# Altium footprint library Connector.PcbLib: 536 footprints (part 34 of 34)
Each footprint in its own frame and in the unit in brackets; x right, y up, seen from the top. Pads: shape width x height; smd on the part's side, far side on the other; paste and mask are expansions set on the pad; w line width, h text height; cw(c..) or ccw(c..) is an arc to the next point about the centre after c.
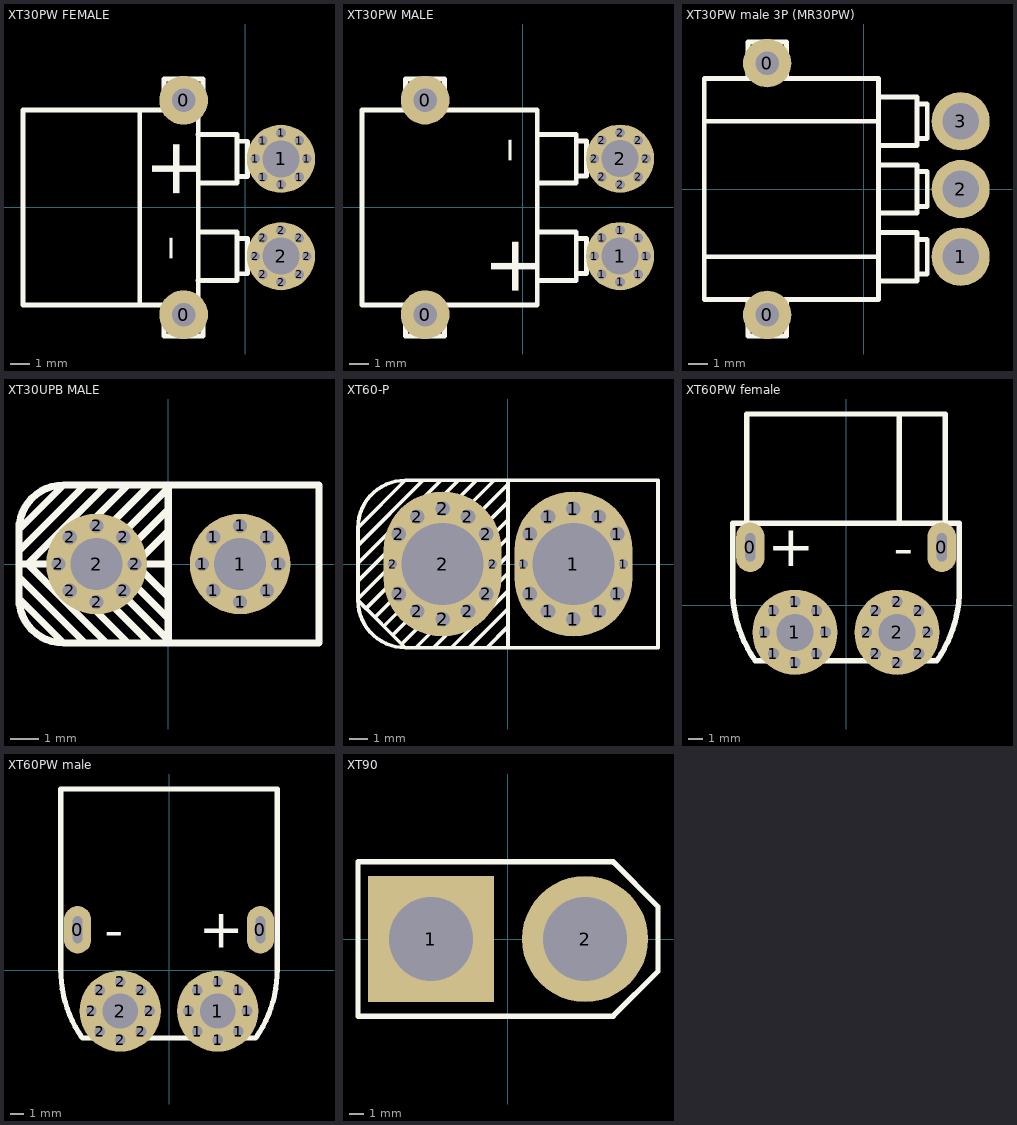
[diagram p33: the footprints below, top view; thin cyan lines are the x and y axes]

## XT30PW FEMALE [mm] "XT30PW卧式母头"
pads (20):
  round 2.5 hole 1.2: 0(-3.175,-5.5) 0(-3.175,5.5)
  round 0.75 hole 0.5: 1(0.5,2.5) 1(0.888,1.563) 1(0.888,3.437) 1(1.825,1.175) 1(1.825,3.825) 1(2.762,1.563) 1(2.762,3.437) 1(3.15,2.5) 2(0.5,-2.5) 2(0.888,-1.563) 2(0.888,-3.437) 2(1.825,-3.825) 2(1.825,-1.175) 2(2.762,-3.437) 2(2.762,-1.563) 2(3.15,-2.5)
  round 3.5 hole 1.9: 1(1.825,2.5) 2(1.825,-2.5)
Top Overlay:
  lines w0.254: -5.425,-5 -5.425,5 ; -4.175,-5 -4.175,-6.592 -2.175,-6.592 -2.175,-5 ; -4.175,5 -4.175,6.592 -2.175,6.592 -2.175,5 ; -2.425,-3.75 -0.425,-3.75 -0.425,-1.25 -2.425,-1.25 ; -2.425,3.75 -0.425,3.75 -0.425,1.25 -2.425,1.25 ; -0.425,-3.4 0.098,-3.4 0.098,-1.6 -0.425,-1.6 ; -0.425,1.6 0.098,1.6 0.098,3.4 -0.425,3.4 ; -11.425,-5 -2.425,-5 -2.425,5 -11.425,5 -11.425,-5
  text "+" at -5.766,3.648 h5
  text "-" at -5.766,-1.362 h5
3D body: height 2, standoff -2, extent 1.025,-3.3 2.625,-1.7
3D body: height 3.95, standoff 1.45, extent -2.425,-3.75 -0.425,-1.25
3D body: height 2.7, standoff 0, extent 0.925,-3.4 2.725,-1.6
3D body: height 3.6, standoff 1.8, extent -0.69,-3.4 1.81,-1.6
3D body: height 3.6, standoff 1.8, extent 0.926,-3.4 2.725,-1.6
3D body: height 3.6, standoff 1.8, extent 0.926,1.6 2.725,3.4
3D body: height 3.6, standoff 1.8, extent -0.69,1.6 1.81,3.4
3D body: height 2.7, standoff 0, extent 0.925,1.6 2.725,3.4
3D body: height 3.95, standoff 1.45, extent -2.425,1.25 -0.425,3.75
3D body: height 2, standoff -2, extent 1.025,1.7 2.625,3.3
3D body: height 2.7, standoff 0, extent -3.425,-4.996 -2.425,-3.996
3D body: height 2.7, standoff 0.5, extent -3.425,-4.039 -2.425,4.064
3D body: height 4.5, standoff 0.5, extent -11.425,-4.429 -2.425,4.429
3D body: height 4.05, standoff -2, extent -3.675,4.992 -2.675,5.993
3D body: height 4, standoff 0, extent -4.175,4.192 -2.175,6.592
3D body: height 4, standoff 0.5, extent -4.175,2.551 -2.175,4.951
3D body: height 2.7, standoff 0, extent -3.425,4 -2.425,5
3D body: height 4, standoff 0.5, extent -4.175,-4.951 -2.175,-2.551
3D body: height 4, standoff 0, extent -4.175,-6.592 -2.175,-4.192
3D body: height 4.05, standoff -2, extent -3.675,-5.992 -2.675,-4.992
3D body: height 5, standoff 0.02, extent -5.425,-5 -2.425,5

## XT30PW MALE [mm] "XT30PW卧式公头"
pads (20):
  round 2.5 hole 1.2: 0(-5,-5.5) 0(-5,5.5)
  round 0.75 hole 0.5: 1(3.675,-2.5) 1(4.063,-3.437) 1(4.063,-1.563) 1(5,-3.825) 1(5,-1.175) 1(5.937,-3.437) 1(5.937,-1.563) 1(6.325,-2.5) 2(3.675,2.5) 2(4.063,1.563) 2(4.063,3.437) 2(5,1.175) 2(5,3.825) 2(5.937,3.437) 2(5.937,1.563) 2(6.325,2.5)
  round 3.5 hole 1.9: 1(5,-2.5) 2(5,2.5)
Top Overlay:
  lines w0.254: -6.018,-5 -6.018,-6.592 -4.018,-6.592 -4.018,-5 ; -6.018,5 -6.018,6.592 -4.018,6.592 -4.018,5 ; 0.75,-3.75 2.75,-3.75 2.75,-1.25 0.75,-1.25 ; 0.75,3.75 2.75,3.75 2.75,1.25 0.75,1.25 ; 2.75,-3.4 3.273,-3.4 3.273,-1.6 2.75,-1.6 ; 2.75,1.6 3.273,1.6 3.273,3.4 2.75,3.4 ; -8.25,-5 -8.25,5 0.75,5 0.75,-5 -8.25,-5
  text "-" at -2.591,3.638 h5
  text "+" at -2.591,-1.352 h5
3D body: height 2, standoff -2, extent 4.2,-3.3 5.8,-1.7
3D body: height 3.95, standoff 1.45, extent 0.75,-3.75 2.75,-1.25
3D body: height 2.7, standoff 0, extent 4.1,-3.4 5.9,-1.6
3D body: height 3.6, standoff 1.8, extent 2.485,-3.4 4.985,-1.6
3D body: height 3.6, standoff 1.8, extent 4.101,-3.4 5.9,-1.6
3D body: height 3.6, standoff 1.8, extent 4.101,1.6 5.9,3.4
3D body: height 3.6, standoff 1.8, extent 2.485,1.6 4.985,3.4
3D body: height 2.7, standoff 0, extent 4.1,1.6 5.9,3.4
3D body: height 3.95, standoff 1.45, extent 0.75,1.25 2.75,3.75
3D body: height 2, standoff -2, extent 4.2,1.7 5.8,3.3
3D body: height 2.7, standoff 0, extent -0.25,-4.996 0.75,-3.996
3D body: height 2.7, standoff 0.5, extent -0.25,-4.039 0.75,4.064
3D body: height 5, standoff 0.02, extent -8.25,-5 0.75,5
3D body: height 4.05, standoff -2, extent -5.518,4.992 -4.518,5.993
3D body: height 4, standoff 0, extent -6.018,4.192 -4.018,6.592
3D body: height 4, standoff 0.5, extent -6,2.551 -4,4.951
3D body: height 2.7, standoff 0, extent -0.25,4 0.75,5
3D body: height 4, standoff 0.5, extent -6,-4.951 -4,-2.551
3D body: height 4, standoff 0, extent -6.018,-6.592 -4.018,-4.192
3D body: height 4.05, standoff -2, extent -5.518,-5.992 -4.518,-4.992

## XT30PW male 3P (MR30PW) [mm]
pads (5):
  round 2.5 hole 1.2: 0(-5,-6.5) 0(-5,6.5)
  round 3 hole 1.9: 1(5,-3.5) 2(5,0) 3(5,3.5)
Top Overlay:
  lines w0.254: -8.25,-3.5 0.75,-3.5 ; -8.25,3.5 0.75,3.5 ; -6,-5.699 -6,-7.6 -4,-7.6 -4,-5.699 ; -6,5.699 -6,7.6 -4,7.6 -4,5.699 ; 0.75,-4.75 2.75,-4.75 2.75,-2.25 0.75,-2.25 ; 0.75,-1.25 2.75,-1.25 2.75,1.25 0.75,1.25 ; 0.75,2.25 2.75,2.25 2.75,4.75 0.75,4.75 ; 2.75,-4.4 3.273,-4.4 3.273,-2.6 2.75,-2.6 ; 2.75,-0.9 3.273,-0.9 3.273,0.9 2.75,0.9 ; 2.75,2.6 3.273,2.6 3.273,4.4 2.75,4.4 ; -8.25,-5.699 -8.25,5.699 0.75,5.699 0.75,-5.699 -8.25,-5.699
3D body: height 2, standoff -2, extent 4.2,-4.3 5.8,-2.7
3D body: height 2.7, standoff 0, extent 4.1,-4.4 5.9,-2.6
3D body: height 3.6, standoff 1.8, extent 4.101,-4.4 5.9,-2.6
3D body: height 2, standoff -2, extent 4.2,2.7 5.8,4.3
3D body: height 2.7, standoff 0, extent 4.1,2.6 5.9,4.4
3D body: height 3.6, standoff 1.8, extent 4.101,2.6 5.9,4.4
3D body: height 3.6, standoff 1.8, extent 4.101,-0.9 5.9,0.9
3D body: height 2.7, standoff 0, extent 4.1,-0.9 5.9,0.9
3D body: height 2, standoff -2, extent 4.2,-0.8 5.8,0.8
3D body: height 4.05, standoff -2, extent -5.5,-7 -4.5,-6
3D body: height 4.05, standoff -2, extent -5.5,6 -4.5,7
3D body: height 3.6, standoff 1.8, extent 2.485,-4.4 4.985,-2.6
3D body: height 3.6, standoff 1.8, extent 2.485,-0.9 4.985,0.9
3D body: height 3.6, standoff 1.8, extent 2.485,2.6 4.985,4.4
3D body: height 2.7, standoff 0, extent -0.25,4.699 0.75,5.699
3D body: height 3.95, standoff 1.45, extent 0.75,-1.25 2.75,1.25
3D body: height 3.95, standoff 1.45, extent 0.75,-4.75 2.75,-2.25
3D body: height 2.7, standoff 0, extent -0.25,-5.699 0.75,-4.699
3D body: height 4, standoff 0, extent -6,-7.6 -4,-5.2
3D body: height 4, standoff 0.5, extent -6,-5.951 -4,-3.551
3D body: height 4.9, standoff 0.5, extent -8.25,-5.699 0.75,-1.301
3D body: height 2.7, standoff 0.5, extent -0.25,-4.724 0.75,4.75
3D body: height 3.95, standoff 1.45, extent 0.75,2.25 2.75,4.75
3D body: height 4, standoff 0, extent -6,5.2 -4,7.6
3D body: height 4, standoff 0.5, extent -6,3.551 -4,5.951
3D body: height 4.9, standoff 0.5, extent -8.25,1.301 0.75,5.699
3D body: height 4.9, standoff 0.5, extent -8.25,-3.5 0.75,3.5

## XT30UPB MALE [mm]
pads (18):
  round 0.75 hole 0.5: 1(1.175,0) 1(1.563,-0.937) 1(1.563,0.937) 1(2.5,-1.325) 1(2.5,1.325) 1(3.437,-0.937) 1(3.437,0.937) 1(3.825,0) 2(-3.825,0) 2(-3.437,-0.937) 2(-3.437,0.937) 2(-2.5,-1.325) 2(-2.5,1.325) 2(-1.563,-0.937) 2(-1.563,0.937) 2(-1.175,0)
  round 3.5 hole 1.8: 1(2.5,0) 2(-2.5,0)
Top Overlay:
  lines w0.254: -5.2,-0.45 -2.9,-2.75 ; -5.2,0 0,0 ; -5.2,0.45 -2.9,2.75 ; -2.15,-2.75 -4.9,0 -2.15,2.75 ; -1.4,-2.75 -4.15,0 -1.4,2.75 ; -0.65,-2.75 -3.4,0 -0.65,2.75 ; 0,-1.9 -1.9,0 0,1.9 ; 0,-1.15 -1.15,0 0,1.15 ; 0,2.65 -2.65,0 0,-2.65 0,2.75 ; -5.2,-1.2 ccw(c-3.65,-1.2) -3.65,-2.75 ; -5.2,-1.2 -5.2,1.2 ; -5.2,-1.2 -3.65,-2.75 ; -5.2,1.2 cw(c-3.65,1.2) -3.65,2.75 ; -5.2,1.2 -3.65,2.75 ; -3.65,-2.75 5.25,-2.75 5.25,2.75 -3.65,2.75
3D body: height 2, standoff -2, extent 1.7,-0.798 3.294,0.798
3D body: height 2.7, standoff 0, extent 1.602,-0.893 3.398,0.9
3D body: height 3.6, standoff 1.8, extent 1.602,-0.9 3.397,0.9
3D body: height 3.6, standoff 1.8, extent -3.397,-0.9 -1.603,0.9
3D body: height 2.7, standoff 0, extent -3.398,-0.893 -1.602,0.9
3D body: height 2, standoff -2, extent -3.3,-0.798 -1.706,0.798
3D body "User Library-XT30.step": height 12.6, standoff -2.9, extent -5.2,-2.6 5.2,2.7

## XT60-P [mm]
pads (26):
  round 0.9 hole 0.5: 1(0.85,0) 1(6.35,0) 2(-6.35,0) 2(-0.85,0)
  round 1.2 hole 0.8: 1(1.2,-1.65) 1(1.2,1.65) 1(2.2,-2.6) 1(2.2,2.6) 1(5,-2.6) 1(5,2.6) 1(6,-1.65) 1(6,1.65) 2(-6,-1.65) 2(-6,1.65) 2(-5,-2.6) 2(-5,2.6) 2(-2.2,-2.6) 2(-2.2,2.6) 2(-1.2,-1.65) 2(-1.2,1.65)
  round 1.4 hole 0.8: 1(3.6,-3.05) 1(3.6,3.05) 2(-3.6,-3.05) 2(-3.6,3.05)
  oval 6.5x8 hole 4.5: 1(3.6,0) 2(-3.6,0)
Top Overlay:
  lines w0.203: -8.25,-1.911 -1.77,4.57 ; -8.25,-0.933 -2.758,4.558 ; -8.25,0.045 -3.697,4.597 ; -8.25,1.022 -4.686,4.586 ; -7.317,-2.933 -0.042,4.342 ; -6.828,-3.422 0,3.406 0,4.6 ; -6.339,-3.911 0,2.428 0,4.6 ; -5.85,-4.4 0,1.45 0,4.6 ; -5.073,-4.6 0,0.473 ; -4.095,-4.6 0,-0.505 ; -3.117,-4.6 0,-1.483 ; -2.139,-4.6 0,-2.461 ; -1.162,-4.6 0,-3.438 ; -0.781,4.581 -7.806,-2.444 -8.25,-2 ; 0,-4.6 0,4.6 ; -8.25,-2 ccw(c-5.65,-2) -5.65,-4.6 ; -8.25,-2 -8.25,2 ; -8.25,-2 -5.65,-4.6 ; -8.25,2 cw(c-5.65,2) -5.65,4.6 ; -8.25,2 -5.65,4.6 ; -5.65,-4.6 8.25,-4.6 8.25,4.6 -5.65,4.6
3D body "XT60 male.STEP": height 16.3, standoff -4.9, extent -8.102,-4.086 7.798,4.064

## XT60PW female [mm]
pads (20):
  oval 2x3.5 hole 0.7 slot 2 at 90 deg: 0(-6.75,4.075) 0(6.75,4.075)
  round 1.4 hole 0.8: 1(-5.75,-1.925) 1(-5.119,-3.444) 1(-5.119,-0.406) 1(-3.6,-4.075) 1(-3.6,0.225) 1(-2.081,-3.444) 1(-2.081,-0.406) 1(-1.45,-1.925) 2(1.45,-1.925) 2(2.081,-3.444) 2(2.081,-0.406) 2(3.6,-4.075) 2(3.6,0.225) 2(5.119,-3.444) 2(5.119,-0.406) 2(5.75,-1.925)
  round 6 hole 2.6: 1(-3.6,-1.925) 2(3.6,-1.925)
Top Overlay:
  lines w0.381: -7,5.775 -7,13.475 7,13.475 7,5.775 ; -6.402,-3.919 cw(c0.824,1.146) -8,1.175 -8,5.775 8,5.775 8,1.169 ; -6.4,-3.925 6.4,-3.925 ccw(c-0.826,1.14) 7.998,1.169 ; 3.75,5.775 3.75,13.475
  text "-" at 4.79,1.796 h5
  text "+" at -2.2,1.796 h5
3D body: height 2.3, standoff -2, extent -7.055,3.224 -6.445,4.926
3D body: height 2.3, standoff -2, extent 6.445,3.224 7.055,4.926
3D body: height 0.3, standoff -2, extent -4.9,-3.225 -2.3,-0.625
3D body: height 0.3, standoff -2, extent 2.3,-3.225 4.9,-0.625
3D body: height 7.5, standoff 1, extent 0.5,5.775 7,13.475
3D body: height 7.5, standoff 1, extent -7,5.775 3.75,13.475
3D body: height 8.6, standoff 0.3, extent -8.045,-4.079 8.001,5.775

## XT60PW male [mm]
pads (20):
  oval 2x3.5 hole 0.7 slot 2 at 90 deg: 0(-6.75,3) 0(6.75,3)
  round 1.4 hole 0.8: 1(1.45,-3) 1(2.081,-4.519) 1(2.081,-1.481) 1(3.6,-5.15) 1(3.6,-0.85) 1(5.119,-4.519) 1(5.119,-1.481) 1(5.75,-3) 2(-5.75,-3) 2(-5.119,-4.519) 2(-5.119,-1.481) 2(-3.6,-5.15) 2(-3.6,-0.85) 2(-2.081,-4.519) 2(-2.081,-1.481) 2(-1.45,-3)
  round 6 hole 2.6: 1(3.6,-3) 2(-3.6,-3)
Top Overlay:
  lines w0.381: -6.402,-4.994 cw(c0.824,0.071) -8,0.1 -8,13.4 8,13.4 8,0.065 ; -6.4,-5 6.4,-5 ccw(c-0.826,0.065) 7.998,0.094
  text "-" at -4.79,0.721 h5
  text "+" at 2.2,0.721 h5
3D body: height 8.6, standoff 0.3, extent -8.045,-5.154 8.001,13.4

## XT90 [mm]
pads (2):
  rect 9x9 hole 6: 1(-5.5,0)
  round 9 hole 6: 2(5.5,0)
Top Overlay:
  lines w0.254: 7.505,5.5 7.518,5.486
  lines w0.381: -10.7,-5.5 7.5,-5.5 10.7,-2.3 10.7,2.3 ; -10.7,-5.486 -10.7,5.5 7.505,5.5 ; 7.518,5.486 10.702,2.302
3D body: height 19.8, standoff 0, extent -9.601,-4.216 7.29,4.166
3D body: height 19.8, standoff 0, extent 7.29,-4.216 9.449,4.166
3D body: height 8, standoff 0, extent 7.468,-5.486 10.702,5.512
3D body: height 1, standoff -5.5, extent 3.532,-1.968 7.469,1.969
3D body: height 1, standoff -5.5, extent -7.468,-1.968 -3.531,1.969
3D body: height 8, standoff 0, extent -10.744,-5.486 7.468,5.512